# Altium footprint library con-amp.PCBLIB: 295 footprints (part 2 of 19)
Each footprint in its own frame and in the unit in brackets; x right, y up, seen from the top. Pads: shape width x height; smd on the part's side, far side on the other; paste and mask are expansions set on the pad; w line width, h text height; cw(c..) or ccw(c..) is an arc to the next point about the centre after c.
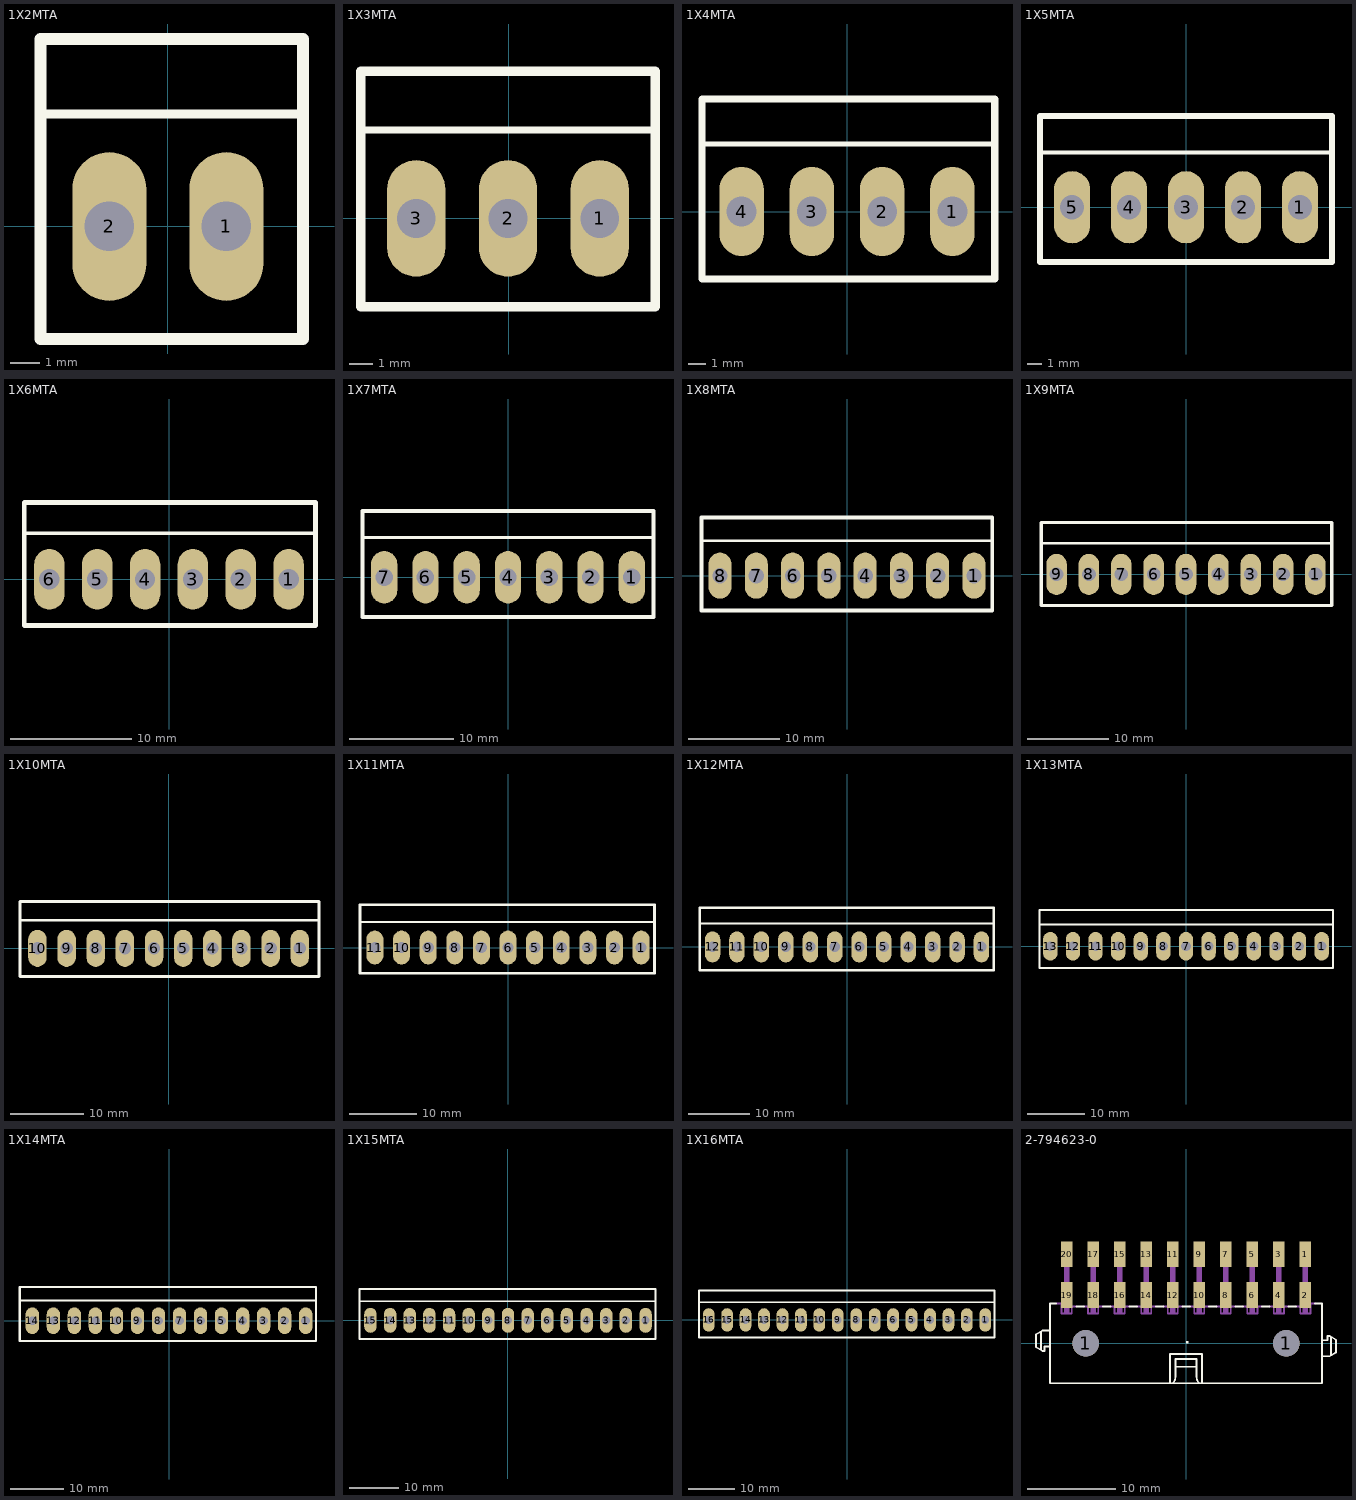
[diagram p1: the footprints below, top view; thin cyan lines are the x and y axes]

## 1X2MTA [mil]
pads (2):
  oval 99x198 hole 66: 1(78,0) 2(-78,0)
Top Overlay:
  rectangle: 58,-20 98,20
  rectangle: -98,-20 -58,20
  lines w12: -170,150 180,150
  lines w16: -170,-150 180,-150 180,150 180,250 -170,250 -170,150 -170,-150

## 1X3MTA [mil]
pads (3):
  oval 99x198 hole 66: 1(155,0) 2(-1,0) 3(-157,0)
Top Overlay:
  rectangle: 135,-20 175,20
  rectangle: -21,-20 19,20
  rectangle: -177,-20 -137,20
  lines w12: -251,150 249,150
  lines w16: -251,-150 -251,150 -251,250 249,250 249,150 249,-150 -251,-150

## 1X4MTA [mil]
pads (4):
  oval 99x198 hole 66: 1(234,0) 2(78,0) 3(-78,0) 4(-234,0)
Top Overlay:
  rectangle: 214,-20 254,20
  rectangle: 58,-20 98,20
  rectangle: -98,-20 -58,20
  rectangle: -254,-20 -214,20
  lines w12: -322,150 328,150
  lines w16: -322,-150 -322,150 -322,250 328,250 328,150 328,-150 -322,-150

## 1X5MTA [mil]
pads (5):
  oval 99x198 hole 66: 1(312,0) 2(156,0) 3(0,0) 4(-156,0) 5(-312,0)
Top Overlay:
  rectangle: 292,-20 332,20
  rectangle: 136,-20 176,20
  rectangle: -20,-20 20,20
  rectangle: -176,-20 -136,20
  rectangle: -332,-20 -292,20
  lines w12: -400,150 400,150
  lines w16: -400,-150 -400,150 -400,250 400,250 400,150 400,-150 -400,-150

## 1X6MTA [mil]
pads (6):
  oval 99x198 hole 66: 1(390,0) 2(234,0) 3(78,0) 4(-78,0) 5(-234,0) 6(-390,0)
Top Overlay:
  rectangle: 370,-20 410,20
  rectangle: 214,-20 254,20
  rectangle: 58,-20 98,20
  rectangle: -98,-20 -58,20
  rectangle: -254,-20 -214,20
  rectangle: -410,-20 -370,20
  lines w12: -472,150 478,150
  lines w16: -472,-150 -472,150 -472,250 478,250 478,150 478,-150 -472,-150

## 1X7MTA [mil]
pads (7):
  oval 99x198 hole 66: 1(468,0) 2(312,0) 3(156,0) 4(0,0) 5(-156,0) 6(-312,0) 7(-468,0)
Top Overlay:
  rectangle: 448,-20 488,20
  rectangle: 292,-20 332,20
  rectangle: 136,-20 176,20
  rectangle: -20,-20 20,20
  rectangle: -176,-20 -136,20
  rectangle: -332,-20 -292,20
  rectangle: -488,-20 -448,20
  lines w12: -550,150 550,150
  lines w16: -550,-150 -550,150 -550,250 550,250 550,150 550,-150 -550,-150

## 1X8MTA [mil]
pads (8):
  oval 99x198 hole 66: 1(546,0) 2(390,0) 3(234,0) 4(78,0) 5(-78,0) 6(-234,0) 7(-390,0) 8(-546,0)
Top Overlay:
  rectangle: 526,-20 566,20
  rectangle: 370,-20 410,20
  rectangle: 214,-20 254,20
  rectangle: 58,-20 98,20
  rectangle: -98,-20 -58,20
  rectangle: -254,-20 -214,20
  rectangle: -410,-20 -370,20
  rectangle: -566,-20 -526,20
  lines w12: -626,150 624,150
  lines w16: -626,-150 624,-150 624,150 624,250 -626,250 -626,150 -626,-150

## 1X9MTA [mil]
pads (9):
  oval 99x198 hole 66: 1(624,0) 2(468,0) 3(312,0) 4(156,0) 5(0,0) 6(-156,0) 7(-312,0) 8(-468,0) 9(-624,0)
Top Overlay:
  rectangle: 604,-20 644,20
  rectangle: 448,-20 488,20
  rectangle: 292,-20 332,20
  rectangle: 136,-20 176,20
  rectangle: -20,-20 20,20
  rectangle: -176,-20 -136,20
  rectangle: -332,-20 -292,20
  rectangle: -488,-20 -448,20
  rectangle: -644,-20 -604,20
  lines w12: -698,150 702,150
  lines w16: -698,-150 702,-150 702,150 702,250 -698,250 -698,150 -698,-150

## 1X10MTA [mil]
pads (10):
  oval 99x198 hole 66: 1(702,0) 2(546,0) 3(390,0) 4(234,0) 5(78,0) 6(-78,0) 7(-234,0) 8(-390,0) 9(-546,0) 10(-702,0)
Top Overlay:
  rectangle: 682,-20 722,20
  rectangle: 526,-20 566,20
  rectangle: 370,-20 410,20
  rectangle: 214,-20 254,20
  rectangle: 58,-20 98,20
  rectangle: -98,-20 -58,20
  rectangle: -254,-20 -214,20
  rectangle: -410,-20 -370,20
  rectangle: -566,-20 -526,20
  rectangle: -722,-20 -682,20
  lines w12: -795,150 805,150
  lines w16: -795,-150 805,-150 805,150 805,250 -795,250 -795,150 -795,-150

## 1X11MTA [mil]
pads (11):
  oval 99x198 hole 66: 1(780,0) 2(624,0) 3(468,0) 4(312,0) 5(156,0) 6(0,0) 7(-156,0) 8(-312,0) 9(-468,0) 10(-624,0) 11(-780,0)
Top Overlay:
  rectangle: 760,-20 800,20
  rectangle: 604,-20 644,20
  rectangle: 448,-20 488,20
  rectangle: 292,-20 332,20
  rectangle: 136,-20 176,20
  rectangle: -20,-20 20,20
  rectangle: -176,-20 -136,20
  rectangle: -332,-20 -292,20
  rectangle: -488,-20 -448,20
  rectangle: -644,-20 -604,20
  rectangle: -644,-20 -604,20
  rectangle: -800,-20 -760,20
  lines w12: -867,150 858,150
  lines w16: -867,-150 858,-150 858,150 858,250 -867,250 -867,150 -867,-150

## 1X12MTA [mil]
pads (12):
  oval 99x198 hole 66: 1(858,0) 2(702,0) 3(546,0) 4(390,0) 5(234,0) 6(78,0) 7(-78,0) 8(-234,0) 9(-390,0) 10(-546,0) 11(-702,0) 12(-858,0)
Top Overlay:
  rectangle: 838,-20 878,20
  rectangle: 682,-20 722,20
  rectangle: 526,-20 566,20
  rectangle: 370,-20 410,20
  rectangle: 214,-20 254,20
  rectangle: 58,-20 98,20
  rectangle: -98,-20 -58,20
  rectangle: -254,-20 -214,20
  rectangle: -410,-20 -370,20
  rectangle: -566,-20 -526,20
  rectangle: -722,-20 -682,20
  rectangle: -878,-20 -838,20
  lines w12: -939,150 936,150
  lines w16: -939,-150 936,-150 936,150 936,250 -939,250 -939,150 -939,-150

## 1X13MTA [mil]
pads (13):
  oval 99x198 hole 66: 1(936,0) 2(780,0) 3(624,0) 4(468,0) 5(312,0) 6(156,0) 7(0,0) 8(-156,0) 9(-312,0) 10(-468,0) 11(-624,0) 12(-780,0) 13(-936,0)
Top Overlay:
  rectangle: 916,-20 956,20
  rectangle: 760,-20 800,20
  rectangle: 604,-20 644,20
  rectangle: 448,-20 488,20
  rectangle: 292,-20 332,20
  rectangle: 136,-20 176,20
  rectangle: -20,-20 20,20
  rectangle: -176,-20 -136,20
  rectangle: -332,-20 -292,20
  rectangle: -488,-20 -448,20
  rectangle: -644,-20 -604,20
  rectangle: -800,-20 -760,20
  rectangle: -956,-20 -916,20
  lines w12: -1011,150 1014,150
  lines w16: -1011,-150 1014,-150 1014,150 1014,250 -1011,250 -1011,150 -1011,-150

## 1X14MTA [mil]
pads (14):
  oval 99x198 hole 66: 1(1014,0) 2(858,0) 3(702,0) 4(546,0) 5(390,0) 6(234,0) 7(78,0) 8(-78,0) 9(-234,0) 10(-390,0) 11(-546,0) 12(-702,0) 13(-858,0) 14(-1014,0)
Top Overlay:
  rectangle: 994,-20 1034,20
  rectangle: 838,-20 878,20
  rectangle: 682,-20 722,20
  rectangle: 526,-20 566,20
  rectangle: 370,-20 410,20
  rectangle: 214,-20 254,20
  rectangle: 58,-20 98,20
  rectangle: -98,-20 -58,20
  rectangle: -254,-20 -214,20
  rectangle: -410,-20 -370,20
  rectangle: -566,-20 -526,20
  rectangle: -722,-20 -682,20
  rectangle: -878,-20 -838,20
  rectangle: -1034,-20 -994,20
  lines w12: -1108,150 1092,150
  lines w16: -1108,-150 1092,-150 1092,150 1092,250 -1108,250 -1108,150 -1108,-150

## 1X15MTA [mil]
pads (15):
  oval 99x198 hole 66: 1(1092,0) 2(936,0) 3(780,0) 4(624,0) 5(468,0) 6(312,0) 7(156,0) 8(0,0) 9(-156,0) 10(-312,0) 11(-468,0) 12(-624,0) 13(-780,0) 14(-936,0) 15(-1092,0)
Top Overlay:
  rectangle: 1072,-20 1112,20
  rectangle: 916,-20 956,20
  rectangle: 760,-20 800,20
  rectangle: 604,-20 644,20
  rectangle: 448,-20 488,20
  rectangle: 292,-20 332,20
  rectangle: 136,-20 176,20
  rectangle: -20,-20 20,20
  rectangle: -176,-20 -136,20
  rectangle: -332,-20 -292,20
  rectangle: -488,-20 -448,20
  rectangle: -644,-20 -604,20
  rectangle: -800,-20 -760,20
  rectangle: -956,-20 -916,20
  rectangle: -1112,-20 -1072,20
  lines w12: -1180,150 1170,150
  lines w16: -1180,-150 1170,-150 1170,150 1170,250 -1180,250 -1180,150 -1180,-150

## 1X16MTA [mil]
pads (16):
  oval 99x198 hole 66: 1(1170,0) 2(1014,0) 3(858,0) 4(702,0) 5(546,0) 6(390,0) 7(234,0) 8(78,0) 9(-78,0) 10(-234,0) 11(-390,0) 12(-546,0) 13(-702,0) 14(-858,0) 15(-1014,0) 16(-1170,0)
Top Overlay:
  rectangle: 1150,-20 1190,20
  rectangle: 994,-20 1034,20
  rectangle: 838,-20 878,20
  rectangle: 682,-20 722,20
  rectangle: 526,-20 566,20
  rectangle: 370,-20 410,20
  rectangle: 214,-20 254,20
  rectangle: 58,-20 98,20
  rectangle: -98,-20 -58,20
  rectangle: -254,-20 -214,20
  rectangle: -410,-20 -370,20
  rectangle: -566,-20 -526,20
  rectangle: -722,-20 -682,20
  rectangle: -878,-20 -838,20
  rectangle: -1034,-20 -994,20
  rectangle: -1190,-20 -1150,20
  lines w12: -1252,150 1248,150
  lines w16: -1252,-150 1248,-150 1248,150 1248,250 -1252,250 -1252,150 -1252,-150

## 2-794623-0 [mm]
pads (22):
  round 3 hole 3: 1(-11.35,0) 1(11.35,0)
  rect 1.3x2.92 smd: 1(13.5,10.1) 2(13.5,5.48) 3(10.5,10.1) 4(10.5,5.48) 5(7.5,10.1) 6(7.5,5.48) 7(4.5,10.1) 8(4.5,5.48) 9(1.5,10.1) 10(1.5,5.48) 11(-1.5,10.1) 12(-1.5,5.48) 13(-4.5,10.1) 14(-4.5,5.48) 15(-7.5,10.1) 16(-7.5,5.48) 17(-10.5,10.1) 18(-10.5,5.48) 19(-13.5,5.48) 20(-13.5,10.1)
Top Overlay:
  region: 0,0 0.254,0 0.254,0.254 0,0.254
  region: 0,0 0.254,0 0.254,0.254 0,0.254
  region: 0,0 0.254,0 0.254,0.254 0,0.254
  region: 0,0 0.254,0 0.254,0.254 0,0.254
  lines w0.203: -16.4,-0.7 -16.4,1.3 ; -15.5,-0.35 -16.025,-0.35 -16.025,-0.85 -16.25,-0.85 -16.975,-0.425 -16.975,1.025 -16.25,1.45 -15.5,1.45 ; -14.675,4.525 -15.4,4.525 -15.4,-4.5 15.4,-4.5 15.4,4.525 14.6,4.525 ; -12.425,4.175 -11.55,4.175 ; -9.425,4.175 -8.55,4.175 ; -6.425,4.175 -5.55,4.175 ; -3.425,4.175 -2.55,4.175 ; -1.8,-4.4 -1.8,-1.2 1.8,-1.2 1.8,-4.4 ; -1.425,-4.45 ccw(c-2.325,-3.775) -1.2,-3.775 -1.2,-2.65 ; -0.425,4.175 0.45,4.175 ; 1.425,-4.45 cw(c2.325,-3.775) 1.2,-3.775 1.2,-2.65 ; 2.575,4.175 3.45,4.175 ; 5.575,4.175 6.45,4.175 ; 8.575,4.175 9.45,4.175 ; 11.575,4.175 12.45,4.175 ; 15.5,-1.45 16.25,-1.45 16.975,-1.025 16.975,0.425 16.25,0.85 16.025,0.85 16.025,0.35 15.5,0.35 ; 16.4,-1.3 16.4,0.7 ; -1.2,-2.65 1.2,-2.65 ; -1.2,-2.65 -1.2,-1.75 1.2,-1.75 1.2,-2.65
Mechanical 16:
  rectangle: 13.187,3.513 13.825,11.025
  rectangle: 10.187,3.513 10.825,11.025
  rectangle: 7.187,3.513 7.825,11.025
  rectangle: 4.187,3.513 4.825,11.025
  rectangle: 1.187,3.513 1.825,11.025
  rectangle: -1.813,3.513 -1.175,11.025
  rectangle: -4.813,3.513 -4.175,11.025
  rectangle: -7.813,3.513 -7.175,11.025
  rectangle: -10.813,3.513 -10.175,11.025
  rectangle: -13.813,3.513 -13.175,11.025
  lines w0.203: -14.675,4.525 -14.075,4.525 -14.075,3.4 -12.925,3.4 -12.925,4.175 -12.425,4.175 ; -11.55,4.175 -11.075,4.175 -11.075,3.4 -9.925,3.4 -9.925,4.175 -9.425,4.175 ; -8.55,4.175 -8.075,4.175 -8.075,3.4 -6.925,3.4 -6.925,4.175 -6.425,4.175 ; -5.55,4.175 -5.075,4.175 -5.075,3.4 -3.925,3.4 -3.925,4.175 -3.425,4.175 ; -2.55,4.175 -2.075,4.175 -2.075,3.4 -0.925,3.4 -0.925,4.175 -0.425,4.175 ; 0.45,4.175 0.925,4.175 0.925,3.4 2.075,3.4 2.075,4.175 2.575,4.175 ; 3.45,4.175 3.925,4.175 3.925,3.4 5.075,3.4 5.075,4.175 5.575,4.175 ; 6.45,4.175 6.925,4.175 6.925,3.4 8.075,3.4 8.075,4.175 8.575,4.175 ; 9.45,4.175 9.925,4.175 9.925,3.4 11.075,3.4 11.075,4.175 11.575,4.175 ; 12.45,4.175 12.925,4.175 12.925,3.4 14.075,3.4 14.075,4.525 14.6,4.525